# Altium footprint library MOD.PcbLib: 8 footprints
Each footprint in its own frame and in the unit in brackets; x right, y up, seen from the top. Pads: shape width x height; smd on the part's side, far side on the other; paste and mask are expansions set on the pad; w line width, h text height; cw(c..) or ccw(c..) is an arc to the next point about the centre after c.
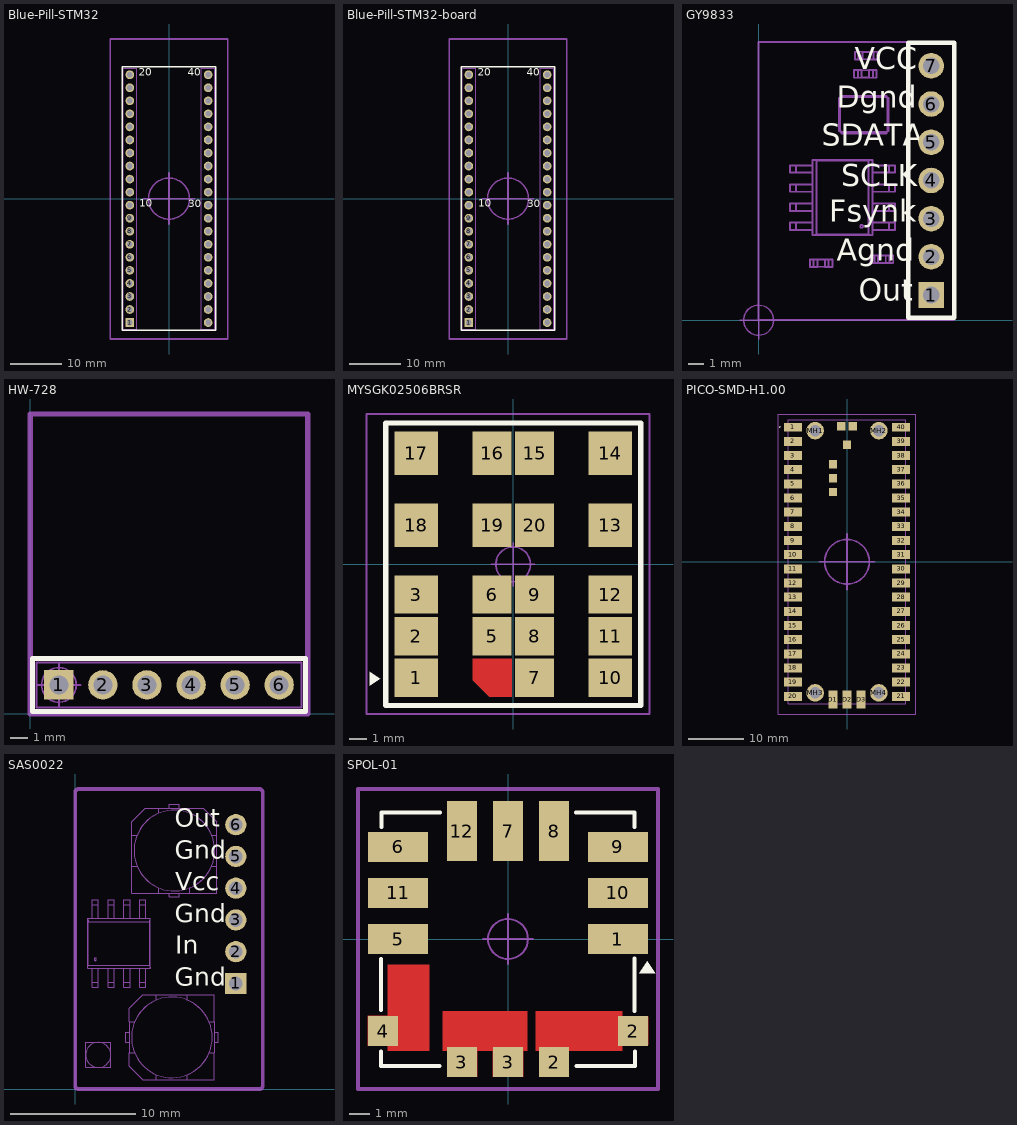
[diagram p0: the footprints below, top view; thin cyan lines are the x and y axes]

## Blue-Pill-STM32 [mm]
pads (40):
  rect 1.7x1.7 hole 1.1: 1(-7.62,-24.13)
  round 1.7 hole 1.1: 2(-7.62,-21.59) 3(-7.62,-19.05) 4(-7.62,-16.51) 5(-7.62,-13.97) 6(-7.62,-11.43) 7(-7.62,-8.89) 8(-7.62,-6.35) 9(-7.62,-3.81) 10(-7.62,-1.27) 11(-7.62,1.27) 12(-7.62,3.81) 13(-7.62,6.35) 14(-7.62,8.89) 15(-7.62,11.43) 16(-7.62,13.97) 17(-7.62,16.51) 18(-7.62,19.05) 19(-7.62,21.59) 20(-7.62,24.13) 21(7.62,-24.13) 22(7.62,-21.59) 23(7.62,-19.05) 24(7.62,-16.51) 25(7.62,-13.97) 26(7.62,-11.43) 27(7.62,-8.89) 28(7.62,-6.35) 29(7.62,-3.81) 30(7.62,-1.27) 31(7.62,1.27) 32(7.62,3.81) 33(7.62,6.35) 34(7.62,8.89) 35(7.62,11.43) 36(7.62,13.97) 37(7.62,16.51) 38(7.62,19.05) 39(7.62,21.59) 40(7.62,24.13)
Top Overlay:
  lines w0.3: -9.144,-25.654 -9.144,25.654 9.144,25.654 9.144,-25.654 -9.144,-25.654
  text "20" at -5.86,23.479 h2.5
  text "10" at -5.819,-2.021 h2.5
  text "30" at 3.745,-2.171 h2.5
  text "40" at 3.646,23.479 h2.5
Bottom Overlay:
  lines w0.3: -9.144,-25.654 -9.144,25.654 9.144,25.654 9.144,-25.654 -9.144,-25.654
Top Assembly:
  lines w0.1: -8.915,-25.425 -8.915,25.425 -6.325,25.425 -6.325,-25.425 -8.915,-25.425 ; 6.325,-25.425 6.325,25.425 8.915,25.425 8.915,-25.425 6.325,-25.425
  lines w0.254: -7.805,23.945 -7.475,23.945
Top Component Outline:
  lines w0.3: -11.43,-27.33 -11.43,31.09 11.43,31.09 11.43,-27.33 -11.43,-27.33
Top Component Center:
  circle w0.3: c0,0 r4
  lines w0.3: -5,0 5,0 ; 0,-5 0,5
3D body "PBS-1x1 2.54.stp": height 8.5, standoff -3.2, extent -8.865,22.858 -6.325,25.398
3D body "PBS-1x1 2.54.stp": height 8.5, standoff -3.2, extent -8.865,20.318 -6.325,22.858
3D body "PBS-1x1 2.54.stp": height 8.5, standoff -3.2, extent -8.865,17.778 -6.325,20.318
3D body "PBS-1x1 2.54.stp": height 8.5, standoff -3.2, extent -8.865,15.238 -6.325,17.778
3D body "PBS-1x1 2.54.stp": height 8.5, standoff -3.2, extent -8.865,12.698 -6.325,15.238
3D body "PBS-1x1 2.54.stp": height 8.5, standoff -3.2, extent -8.865,10.158 -6.325,12.698
3D body "PBS-1x1 2.54.stp": height 8.5, standoff -3.2, extent -8.865,7.618 -6.325,10.158
3D body "PBS-1x1 2.54.stp": height 8.5, standoff -3.2, extent -8.865,5.078 -6.325,7.618
3D body "PBS-1x1 2.54.stp": height 8.5, standoff -3.2, extent -8.865,2.538 -6.325,5.078
3D body "PBS-1x1 2.54.stp": height 8.5, standoff -3.2, extent -8.865,-0.002 -6.325,2.538
3D body "PBS-1x1 2.54.stp": height 8.5, standoff -3.2, extent -8.865,-2.542 -6.325,-0.002
3D body "PBS-1x1 2.54.stp": height 8.5, standoff -3.2, extent -8.865,-5.082 -6.325,-2.542
3D body "PBS-1x1 2.54.stp": height 8.5, standoff -3.2, extent -8.865,-7.622 -6.325,-5.082
3D body "PBS-1x1 2.54.stp": height 8.5, standoff -3.2, extent -8.865,-10.162 -6.325,-7.622
3D body "PBS-1x1 2.54.stp": height 8.5, standoff -3.2, extent -8.865,-12.702 -6.325,-10.162
3D body "PBS-1x1 2.54.stp": height 8.5, standoff -3.2, extent -8.865,-15.242 -6.325,-12.702
3D body "PBS-1x1 2.54.stp": height 8.5, standoff -3.2, extent -8.865,-17.782 -6.325,-15.242
3D body "PBS-1x1 2.54.stp": height 8.5, standoff -3.2, extent -8.865,-20.322 -6.325,-17.782
3D body "PBS-1x1 2.54.stp": height 8.5, standoff -3.2, extent -8.865,-22.862 -6.325,-20.322
3D body "PBS-1x1 2.54.stp": height 8.5, standoff -3.2, extent -8.865,-25.402 -6.325,-22.862
3D body "PBS-1x1 2.54.stp": height 8.5, standoff -3.2, extent 6.375,22.858 8.915,25.398
3D body "PBS-1x1 2.54.stp": height 8.5, standoff -3.2, extent 6.375,20.318 8.915,22.858
3D body "PBS-1x1 2.54.stp": height 8.5, standoff -3.2, extent 6.375,17.778 8.915,20.318
3D body "PBS-1x1 2.54.stp": height 8.5, standoff -3.2, extent 6.375,15.238 8.915,17.778
3D body "PBS-1x1 2.54.stp": height 8.5, standoff -3.2, extent 6.375,12.698 8.915,15.238
3D body "PBS-1x1 2.54.stp": height 8.5, standoff -3.2, extent 6.375,10.158 8.915,12.698
3D body "PBS-1x1 2.54.stp": height 8.5, standoff -3.2, extent 6.375,7.618 8.915,10.158
3D body "PBS-1x1 2.54.stp": height 8.5, standoff -3.2, extent 6.375,5.078 8.915,7.618
3D body "PBS-1x1 2.54.stp": height 8.5, standoff -3.2, extent 6.375,2.538 8.915,5.078
3D body "PBS-1x1 2.54.stp": height 8.5, standoff -3.2, extent 6.375,-0.002 8.915,2.538
3D body "PBS-1x1 2.54.stp": height 8.5, standoff -3.2, extent 6.375,-2.542 8.915,-0.002
3D body "PBS-1x1 2.54.stp": height 8.5, standoff -3.2, extent 6.375,-5.082 8.915,-2.542
3D body "PBS-1x1 2.54.stp": height 8.5, standoff -3.2, extent 6.375,-7.622 8.915,-5.082
3D body "PBS-1x1 2.54.stp": height 8.5, standoff -3.2, extent 6.375,-10.162 8.915,-7.622
3D body "PBS-1x1 2.54.stp": height 8.5, standoff -3.2, extent 6.375,-12.702 8.915,-10.162
3D body "PBS-1x1 2.54.stp": height 8.5, standoff -3.2, extent 6.375,-15.242 8.915,-12.702
3D body "PBS-1x1 2.54.stp": height 8.5, standoff -3.2, extent 6.375,-17.782 8.915,-15.242
3D body "PBS-1x1 2.54.stp": height 8.5, standoff -3.2, extent 6.375,-20.322 8.915,-17.782
3D body "PBS-1x1 2.54.stp": height 8.5, standoff -3.2, extent 6.375,-22.862 8.915,-20.322
3D body "PBS-1x1 2.54.stp": height 8.5, standoff -3.2, extent 6.375,-25.402 8.915,-22.862
3D body "Blue-Pill-STM32.step": height 22, standoff 1.9, extent -11.43,-27.331 11.43,31.09

## Blue-Pill-STM32-board [mm]
pads (40):
  rect 1.7x1.7 hole 1.1: 1(-7.62,-24.13)
  round 1.7 hole 1.1: 2(-7.62,-21.59) 3(-7.62,-19.05) 4(-7.62,-16.51) 5(-7.62,-13.97) 6(-7.62,-11.43) 7(-7.62,-8.89) 8(-7.62,-6.35) 9(-7.62,-3.81) 10(-7.62,-1.27) 11(-7.62,1.27) 12(-7.62,3.81) 13(-7.62,6.35) 14(-7.62,8.89) 15(-7.62,11.43) 16(-7.62,13.97) 17(-7.62,16.51) 18(-7.62,19.05) 19(-7.62,21.59) 20(-7.62,24.13) 21(7.62,-24.13) 22(7.62,-21.59) 23(7.62,-19.05) 24(7.62,-16.51) 25(7.62,-13.97) 26(7.62,-11.43) 27(7.62,-8.89) 28(7.62,-6.35) 29(7.62,-3.81) 30(7.62,-1.27) 31(7.62,1.27) 32(7.62,3.81) 33(7.62,6.35) 34(7.62,8.89) 35(7.62,11.43) 36(7.62,13.97) 37(7.62,16.51) 38(7.62,19.05) 39(7.62,21.59) 40(7.62,24.13)
Top Overlay:
  lines w0.3: -9.144,-25.654 9.144,-25.654 9.144,25.654 -9.144,25.654 -9.144,-25.654
  text "40" at 3.646,23.479 h2.5
  text "30" at 3.745,-2.171 h2.5
  text "10" at -5.819,-2.021 h2.5
  text "20" at -5.86,23.479 h2.5
Bottom Overlay:
  lines w0.3: -9.144,-25.654 9.144,-25.654 9.144,25.654 -9.144,25.654 -9.144,-25.654
Top Assembly:
  lines w0.1: -8.915,-25.425 -6.325,-25.425 -6.325,25.425 -8.915,25.425 -8.915,-25.425 ; 6.325,-25.425 8.915,-25.425 8.915,25.425 6.325,25.425 6.325,-25.425
  lines w0.254: -7.805,23.945 -7.475,23.945
Top Component Outline:
  lines w0.3: -11.43,-27.33 11.43,-27.33 11.43,31.09 -11.43,31.09 -11.43,-27.33
Top Component Center:
  circle w0.3: c0,0 r4
  lines w0.3: -5,0 5,0 ; 0,-5 0,5
3D body "Blue-Pill-STM32.step": height 13.5, standoff -6.6, extent -11.43,-27.331 11.43,31.09

## GY9833 [mm]
pads (7):
  rect 1.7x1.7 hole 1.1: 1(11.475,1.675)
  round 1.7 hole 1.1: 2(11.475,4.215) 3(11.475,6.755) 4(11.475,9.295) 5(11.475,11.835) 6(11.475,14.375) 7(11.475,16.915)
Top Overlay:
  lines w0.3: 9.951,0.151 12.999,0.151 12.999,18.439 9.951,18.439 9.951,0.151
  text "Out" at 6.668,0.8 h2.5
  text "Agnd" at 5.193,3.454 h2.5
  text "Fsynk" at 4.693,6.056 h2.5
  text "SCLK" at 5.502,8.4 h2.5
  text "SDATA" at 4.202,11.1 h2.5
  text "Dgnd" at 5.179,13.614 h2.5
  text "VCC" at 6.395,16.2 h2.5
Top Assembly:
  drawing of 316 lines, arcs and shapes, not listed
Top Component Center:
  circle w0.1: c0,0 r1
  lines w0.1: -1.25,0 1.25,0 ; 0,-1.25 0,1.25
3D body "GY9833.step": height 5.75, standoff -6.13, extent 0,0 13,18.5

## HW-728 [mm]
pads (6):
  rect 1.7x1.7 hole 1.1: 1(1.651,1.676)
  round 1.7 hole 1.1: 2(4.191,1.676) 3(6.731,1.676) 4(9.271,1.676) 5(11.811,1.676) 6(14.351,1.676)
Top Overlay:
  lines w0.3: 0.127,0.152 15.875,0.152 15.875,3.2 0.127,3.2 0.127,0.152
Bottom Overlay:
  lines w0.3: 0.127,0.152 15.875,0.152 15.875,3.2 0.127,3.2 0.127,0.152
Top Assembly:
  lines w0.1: 0.356,0.381 0.356,2.972 15.646,2.972 15.646,0.381 0.356,0.381
Top 3D Body:
  lines w0.3: 0,0 0,17.3 16,17.3 16,0 0,0
Top Component Outline:
  circle w0.1: c1.651,1.676 r1
  lines w0.1: 0.401,1.676 2.901,1.676 ; 1.651,0.426 1.651,2.926
  lines w0.3: 0.127,0.152 15.875,0.152 15.875,3.2 0.127,3.2 0.127,0.152
3D body: height 10.5, standoff 8.5, extent 0,0 16.002,17.297
3D body "PBS-1x1 2.54.stp": height 8.5, standoff -3.2, extent 13.079,0.381 15.619,2.921
3D body "PBS-1x1 2.54.stp": height 8.5, standoff -3.2, extent 10.539,0.381 13.079,2.921
3D body "PBS-1x1 2.54.stp": height 8.5, standoff -3.2, extent 7.999,0.381 10.539,2.921
3D body "PBS-1x1 2.54.stp": height 8.5, standoff -3.2, extent 5.459,0.381 7.999,2.921
3D body "PBS-1x1 2.54.stp": height 8.5, standoff -3.2, extent 2.919,0.381 5.459,2.921
3D body "PBS-1x1 2.54.stp": height 8.5, standoff -3.2, extent 0.379,0.381 2.919,2.921

## MYSGK02506BRSR [mm]
pads (20):
  rect 2.5x2.2 smd mask+0.152: 1(-5.6,-6.55) 2(-5.6,-4.15) 3(-5.6,-1.75) 10(5.6,-6.55) 11(5.6,-4.15) 12(5.6,-1.75)
  round 0.025 smd mask+0.152: 4(-1.225,-6.55)
  rect 2.25x2.2 smd mask+0.152: 5(-1.225,-4.15) 6(-1.225,-1.75) 7(1.225,-6.55) 8(1.225,-4.15) 9(1.225,-1.75)
  rect 2.5x2.5 smd mask+0.152: 13(5.6,2.25) 14(5.6,6.4) 17(-5.6,6.4) 18(-5.6,2.25)
  rect 2.25x2.5 smd mask+0.152: 15(1.225,6.4) 16(-1.225,6.4) 19(-1.225,2.25) 20(1.225,2.25)
Top Layer:
  region: -2.35,-5.45 -2.35,-6.7 -1.4,-7.65 -0.1,-7.65 -0.1,-5.45
Top Overlay:
  region: -8.271,-6.204 -8.271,-7.004 -7.671,-6.604
  lines w0.3: -7.35,-8.15 7.35,-8.15 7.35,8.15 -7.35,8.15 -7.35,-8.15
Top Assembly:
  lines w0.15: -7.35,-8.15 7.35,-8.15 7.35,8.15 -7.35,8.15 -7.35,-8.15
Top Component Outline:
  lines w0.1: -8.458,-8.636 7.849,-8.636 7.849,8.661 -8.458,8.661 -8.458,-8.636
Top Component Center:
  circle w0.1: c-0.006,-0.005 r1
  lines w0.1: -1.256,-0.005 1.244,-0.005 ; -0.006,-1.255 -0.006,1.245
3D body "step_temp.STEP": height 7.5, standoff 0, extent -7.35,-8.15 7.35,8.15

## PICO-SMD-H1.00 [mm]
pads (53):
  rect 3.2x1.6 smd: 1(-9.69,24.13) 2(-9.69,21.59) 3(-9.69,19.05) 4(-9.69,16.51) 5(-9.69,13.97) 6(-9.69,11.43) 7(-9.69,8.89) 8(-9.69,6.35) 9(-9.69,3.81) 10(-9.69,1.27) 11(-9.69,-1.27) 12(-9.69,-3.81) 13(-9.69,-6.35) 14(-9.69,-8.89) 15(-9.69,-11.43) 16(-9.69,-13.97) 17(-9.69,-16.51) 18(-9.69,-19.05) 19(-9.69,-21.59) 20(-9.69,-24.13) 21(9.69,-24.13) 22(9.69,-21.59) 23(9.69,-19.05) 24(9.69,-16.51) 25(9.69,-13.97) 26(9.69,-11.43) 27(9.69,-8.89) 28(9.69,-6.35) 29(9.69,-3.81) 30(9.69,-1.27) 31(9.69,1.27) 32(9.69,3.81) 33(9.69,6.35) 34(9.69,8.89) 35(9.69,11.43) 36(9.69,13.97) 37(9.69,16.51) 38(9.69,19.05) 39(9.69,21.59) 40(9.69,24.13)
  rect 1.6x3.2 smd: D1(-2.54,-24.7) D2(0,-24.7) D3(2.54,-24.7)
  round 3.15 hole 2.1: MH1(-5.7,23.5) MH2(5.7,23.5) MH3(-5.7,-23.5) MH4(5.7,-23.5)
  rect 1.5x1.5 smd: TP1(0,21) TP2(1,24.3) TP3(-1,24.3) TP4(-2.5,17.5) TP5(-2.5,15) TP6(-2.5,12.5)
Top Overlay:
  lines w0.2: -12.1,24.2 ccw(c-12.05,24.2) -12,24.2 ; -12.1,24.2 cw(c-12.05,24.2) -12,24.2 ; -12.1,24.2 ccw(c-12.05,24.2) -12,24.2
Top Assembly:
  lines w0.2: -10.5,-25.5 -10.5,25.5 10.5,25.5 10.5,-25.5 -10.5,-25.5
Top Component Outline:
  lines w0.1: -12.29,-27.3 -12.29,26.5 12.29,26.5 12.29,-27.3 -12.29,-27.3
Top Component Center:
  circle w0.3: c0,0 r4
  lines w0.3: -5,0 5,0 ; 0,-5 0,5
3D body "PICO.stp": height 3.69, standoff 0, extent -10.5,-25.45 10.5,26.976

## SAS0022 [mm]
pads (6):
  rect 1.7x1.7 hole 1.1: 1(12.851,8.449)
  round 1.7 hole 1.1: 2(12.851,10.989) 3(12.851,13.529) 4(12.851,16.069) 5(12.851,18.609) 6(12.851,21.149)
Top Overlay:
  text "Out" at 7.968,20.5 h2.5
  text "Gnd" at 7.968,17.96 h2.5
  text "Vcc" at 7.995,15.42 h2.5
  text "Gnd" at 7.968,12.88 h2.5
  text "In" at 7.993,10.34 h2.5
  text "Gnd" at 7.968,7.8 h2.5
Top Assembly:
  drawing of 290 lines, arcs and shapes, not listed
Top Component Outline:
  lines w0.3: 0,0.254 ccw(c0.254,0.254) 0.254,0 14.746,0 ccw(c14.746,0.254) 15,0.254 15,23.746 ccw(c14.746,23.746) 14.746,24 0.254,24 ccw(c0.254,23.746) 0,23.746 0,0.254
3D body "SAS0022.step": height 14.56, standoff -5.63, extent 0,0 15,24

## SPOL-01 [mm] "dc-dc 3.3"
pads (14):
  rect 3x1.5 smd: 1(5.5,0) 5(-5.5,0) 6(-5.5,4.6) 9(5.5,4.6) 10(5.5,2.3) 11(-5.5,2.3)
  rect 1.5x1.5 smd: 2(2.3,-6.15) 2(6.25,-4.6) 3(-2.3,-6.15) 3(0,-6.15)
  rect 1.5x1.5 smd mask+0.102: 4(-6.25,-4.6)
  rect 1.5x3 smd: 7(0,5.4) 8(2.3,5.4) 12(-2.3,5.4)
Top Layer:
  region: -7,-5.35 -6.025,-5.35 -6.025,-5.6 -3.95,-5.6 -3.95,-1.275 -6.025,-1.275 -6.025,-3.825 -7,-3.825
  region: 1.375,-5.6 1.375,-3.6 5.72,-3.6 5.72,-3.9 7,-3.9 7,-5.3 5.72,-5.3 5.72,-5.6 3.025,-5.6 3.025,-6.9 1.575,-6.9 1.575,-5.6
  region: -3.05,-6.9 -3.05,-5.6 -3.25,-5.6 -3.25,-3.6 0.95,-3.6 0.95,-5.6 0.75,-5.6 0.75,-6.9 -0.75,-6.9 -0.75,-5.589 -1.55,-5.589 -1.55,-6.9
Top Overlay:
  region: 6.563,-1.722 7.363,-1.722 6.963,-1.122
  lines w0.2: -6.35,-5.625 -6.35,-6.35 -3.425,-6.35 ; -6.35,-3.55 -6.35,-1 ; -6.325,5.6 -6.325,6.325 -3.4,6.325 ; 3.4,6.325 6.325,6.325 6.325,5.6 ; 3.425,-6.35 6.35,-6.35 6.35,-5.625 ; 6.325,-3.6 6.325,-0.975
Top Component Outline:
  lines w0.2: -7.5,-7.5 7.5,-7.5 7.5,7.5 -7.5,7.5 -7.5,-7.5
Top Component Center:
  circle w0.1: c0,0 r1
  lines w0.1: -1.25,0 1.25,0 ; 0,-1.25 0,1.25
3D body "SPOL-01.STEP": height 4, standoff 0, extent -6.2,-6.2 6.2,6.2